# Altium footprint library HDR127P.PcbLib: 19 footprints (part 2 of 2)
Each footprint in its own frame and in the unit in brackets; x right, y up, seen from the top. Pads: shape width x height; smd on the part's side, far side on the other; paste and mask are expansions set on the pad; w line width, h text height; cw(c..) or ccw(c..) is an arc to the next point about the centre after c.
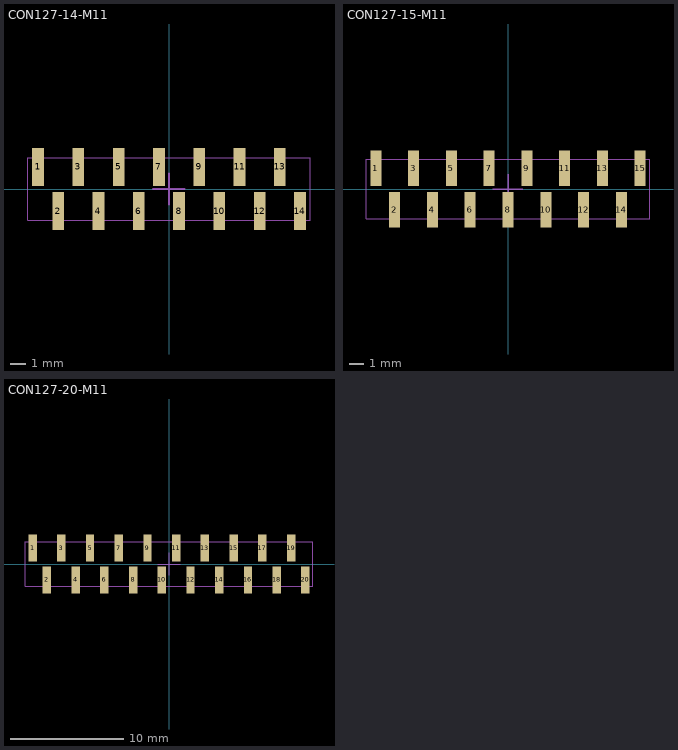
[diagram p1: the footprints below, top view; thin cyan lines are the x and y axes]

## CON127-14-M11 [mm] "1.27mm脚距，排针。联益康电子"
height 5
pads (14):
  rect 0.74x2.4 smd: 1(-8.255,1.4) 2(-6.985,-1.4) 3(-5.715,1.4) 4(-4.445,-1.4) 5(-3.175,1.4) 6(-1.905,-1.4) 7(-0.635,1.4) 8(0.635,-1.4) 9(1.905,1.4) 10(3.175,-1.4) 11(4.445,1.4) 12(5.715,-1.4) 13(6.985,1.4) 14(8.255,-1.4)
Mechanical 13:
  lines w0.05: -8.89,-1.985 8.89,-1.985 8.89,1.985 -8.89,1.985 -8.89,-1.985
Mechanical 15:
  lines w0.1: -1.016,0 1,0 ; 0,-1 0,1
3D body: height 5.3, standoff 0.04, extent -8.89,-1.985 8.89,1.985

## CON127-15-M11 [mm] "1.27mm脚距，排针。联益康电子"
height 5
pads (15):
  rect 0.74x2.4 smd: 1(-8.89,1.4) 2(-7.62,-1.4) 3(-6.35,1.4) 4(-5.08,-1.4) 5(-3.81,1.4) 6(-2.54,-1.4) 7(-1.27,1.4) 8(0,-1.4) 9(1.27,1.4) 10(2.54,-1.4) 11(3.81,1.4) 12(5.08,-1.4) 13(6.35,1.4) 14(7.62,-1.4) 15(8.89,1.4)
Mechanical 13:
  lines w0.05: -9.525,-1.985 9.525,-1.985 9.525,1.985 -9.525,1.985 -9.525,-1.985
Mechanical 15:
  lines w0.1: -1.016,0 1,0 ; 0,-1 0,1
3D body: height 5.3, standoff 0.04, extent -9.525,-1.985 9.525,1.985

## CON127-20-M11 [mm] "1.27mm脚距，排针。联益康电子"
height 5
pads (20):
  rect 0.74x2.4 smd: 1(-12.065,1.4) 2(-10.795,-1.4) 3(-9.525,1.4) 4(-8.255,-1.4) 5(-6.985,1.4) 6(-5.715,-1.4) 7(-4.445,1.4) 8(-3.175,-1.4) 9(-1.905,1.4) 10(-0.635,-1.4) 11(0.635,1.4) 12(1.905,-1.4) 13(3.175,1.4) 14(4.445,-1.4) 15(5.715,1.4) 16(6.985,-1.4) 17(8.255,1.4) 18(9.525,-1.4) 19(10.795,1.4) 20(12.065,-1.4)
Mechanical 13:
  lines w0.05: -12.7,-1.985 12.7,-1.985 12.7,1.985 -12.7,1.985 -12.7,-1.985
Mechanical 15:
  lines w0.1: -1.016,0 1,0 ; 0,-1 0,1
3D body: height 5.3, standoff 0.04, extent -12.7,-1.985 12.7,1.985